# Altium footprint library Regular_Components.PcbLib: 42 footprints (part 3 of 3)
Each footprint in its own frame and in the unit in brackets; x right, y up, seen from the top. Pads: shape width x height; smd on the part's side, far side on the other; paste and mask are expansions set on the pad; w line width, h text height; cw(c..) or ccw(c..) is an arc to the next point about the centre after c.
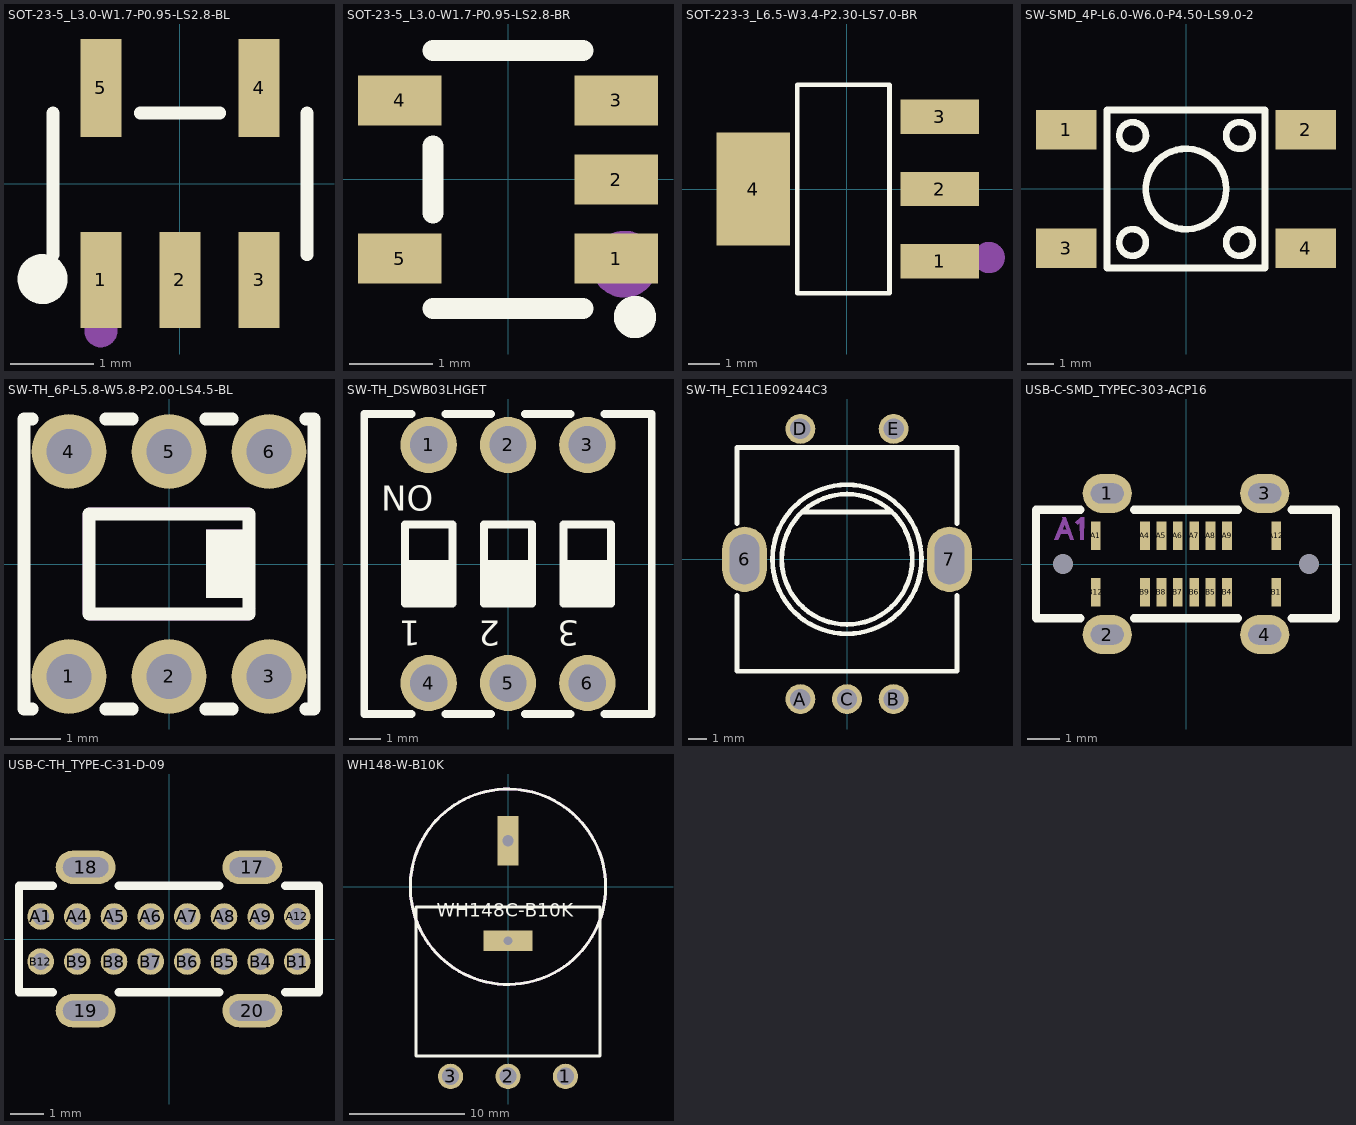
[diagram p2: the footprints below, top view; thin cyan lines are the x and y axes]

## SOT-23-5_L3.0-W1.7-P0.95-LS2.8-BL [mm]
pads (5):
  rect 0.49x1.157 smd: 1(-0.95,-1.154) 2(0,-1.154) 3(0.95,-1.154)
  rect 0.49x1.175 smd: 4(0.95,1.154) 5(-0.95,1.154)
Top Overlay:
  circle w0.3: c-1.651,-1.143 r0.15
  lines w0.152: -1.526,-0.851 -1.526,0.851 ; -0.476,0.851 0.476,0.851 ; 1.526,-0.851 1.526,0.851
Mechanical 15:
  circle w0.2: c-0.95,-1.763 r0.1
3D body "SOT-23-5_L3.0-W1.7-P0.95-LS2.8-BR.STEP": height 1.2, standoff 0, extent -1.37,-1.425 1.414,1.468

## SOT-23-5_L3.0-W1.7-P0.95-LS2.8-BR [mm]
pads (5):
  rect 1x0.6 smd: 1(1.3,-0.95) 2(1.3,0) 3(1.3,0.95) 4(-1.3,0.95) 5(-1.3,-0.95)
Top Overlay:
  circle w0.254: c1.524,-1.651 r0.127
  lines w0.254: -0.9,-1.55 0.9,-1.55 ; -0.9,-0.4 -0.9,0.4 ; -0.9,1.55 0.9,1.55
Mechanical 15:
  circle w0.4: c1.397,-1.016 r0.2
3D body "SOT-23-5_L3.0-W1.7-P0.95-LS2.8-BR.STEP": height 1.2, standoff 0, extent -1.468,-1.37 1.425,1.414

## SOT-223-3_L6.5-W3.4-P2.30-LS7.0-BR [mm]
pads (4):
  rect 2.5x1.1 smd: 1(2.97,-2.3) 2(2.97,0) 3(2.97,2.3)
  rect 2.34x3.6 smd: 4(-2.97,0)
Top Overlay:
  lines w0.152: -1.571,-3.326 -1.571,3.326 1.371,3.326 1.371,-3.326 -1.571,-3.326
Mechanical 15:
  circle w0.5: c4.552,-2.188 r0.25
3D body "SOT-223-3_L6.5-W3.4-P2.30-LS7.0-BR.STEP": height 1.75, standoff 0, extent -3.655,-3.25 3.455,3.25

## SW-SMD_4P-L6.0-W6.0-P4.50-LS9.0-2 [mm]
pads (4):
  rect 2.3x1.5 smd: 1(-4.55,2.25) 2(4.55,2.25) 3(-4.55,-2.25) 4(4.55,-2.25)
Top Overlay:
  circle w0.254: c0,0 r1.529
  circle w0.254: c2.032,-2.032 r0.508
  circle w0.254: c-2.032,-2.032 r0.508
  circle w0.254: c2.032,2.032 r0.508
  circle w0.254: c-2.03,2.03 r0.508
  lines w0.254: -3,-3 3,-3 3,3 -3,3 -3,-3
3D body "SW-SMD_4P-L6.0-W6.0-P4.50-LS9.0-2.STEP": height 3.4, standoff 0, extent -4.2,-3.2 4.2,3.2

## SW-TH_6P-L5.8-W5.8-P2.00-LS4.5-BL [mm]
pads (6):
  round 1.5 hole 0.9: 1(-2,-2.25) 2(0,-2.25) 3(2,-2.25) 4(-2,2.25) 5(0,2.25) 6(2,2.25)
Top Overlay:
  region: 0.74,0.68 0.74,-0.66 0.74,-0.67 1.48,-0.67 1.48,0.68
  lines w0.254: -2.734,-2.9 -2.9,-2.9 -2.9,-1.749 -2.9,1.749 -2.9,2.9 -2.734,2.9 ; -1.266,-2.9 -0.734,-2.9 ; -1.266,2.9 -0.734,2.9 ; 0.734,-2.9 1.266,-2.9 ; 0.734,2.9 1.266,2.9 ; 2.734,-2.9 2.9,-2.9 2.9,-1.749 2.9,1.749 2.9,2.9 2.734,2.9 ; -1.6,-1 -1.6,1 1.6,1 1.6,-1 -1.6,-1
Mechanical 15:
  region: 0.74,0.68 0.74,-0.66 0.74,-0.67 1.48,-0.67 1.48,0.68
  region: 1.6,-0.88 1.72,-0.88 1.6,-1.12 -1.59,-1.12 -1.72,-0.99 -1.72,1.01 -1.61,1.12 1.6,1.12 1.71,1.05 1.71,-0.87 1.48,-0.87 1.48,0.88 -1.48,0.88 -1.48,-0.88
3D body "SW-TH_6P-L5.8-W5.8-P2.00-LS4.5-BL.STEP": height 8, standoff -3.5, extent -2.9,-2.9 2.9,2.901

## SW-TH_DSWB03LHGET [mm]
pads (6):
  round 1.8 hole 1.2: 1(-2.54,3.81) 2(0,3.81) 3(2.54,3.81) 4(-2.54,-3.81) 5(0,-3.81) 6(2.54,-3.81)
Top Overlay:
  lines w0.254: -3.302,-1.016 -1.778,-1.016 ; -3.302,-0.762 -1.778,-0.762 ; -3.302,-0.508 -1.778,-0.508 ; -3.302,-0.254 -1.778,-0.254 ; -3.302,0 -1.778,0 ; -3.084,-4.8 -4.6,-4.8 -4.6,4.8 -3.084,4.8 ; -1.996,-4.8 -0.544,-4.8 ; -1.996,4.8 -0.544,4.8 ; -0.762,-1.016 0.762,-1.016 ; -0.762,-0.762 0.762,-0.762 ; -0.762,-0.508 0.762,-0.508 ; -0.762,-0.254 0.762,-0.254 ; -0.762,0 0.762,0 ; 0.544,-4.8 1.996,-4.8 ; 0.544,4.8 1.996,4.8 ; 1.778,-1.016 3.302,-1.016 ; 1.778,-0.762 3.302,-0.762 ; 1.778,-0.508 3.302,-0.508 ; 1.778,-0.254 3.302,-0.254 ; 1.778,0 3.302,0 ; 3.084,-4.8 4.6,-4.8 4.6,4.8 3.084,4.8 ; -3.302,-1.27 -1.778,-1.27 -1.778,1.27 -3.302,1.27 -3.302,-1.27 ; -0.762,-1.27 0.762,-1.27 0.762,1.27 -0.762,1.27 -0.762,-1.27 ; 1.778,-1.27 3.302,-1.27 3.302,1.27 1.778,1.27 1.778,-1.27
  text "NO" at -4.064,1.703 h0.8
  text "1" at -2.794,-1.815 h0.8
  text "2" at -0.254,-1.815 h0.8
  text "3" at 2.286,-1.815 h0.8
3D body "SW-TH_DSWB03LHGET.STEP": height 6.6, standoff -3.2, extent -4.59,-4.951 4.59,4.95

## SW-TH_EC11E09244C3 [mm]
pads (7):
  oval 2.4x3.5 hole 1.6 slot 2.7 at 90 deg: 6(-5.5,-0.004) 7(5.5,-0.004)
  round 1.6 hole 1.1: A(-2.5,-7.504) B(2.5,-7.504) C(0,-7.504) D(-2.5,6.996) E(2.5,6.996)
Top Overlay:
  circle w0.254: c0,0 r4
  circle w0.254: c0,0 r3.5
  lines w0.254: -5.9,-6.004 5.9,-6.004 5.9,-1.928 ; -5.9,-5.934 -5.9,-1.928 ; -5.9,1.92 -5.9,5.996 5.9,5.996 5.9,1.92 ; -2.41,2.536 2.32,2.536
3D body "SW-TH_EC11E09244C3.STEP": height 19.49, standoff -3.51, extent -6.423,-7.45 6.42,7.45

## USB-C-SMD_TYPEC-303-ACP16 [mm]
pads (22):
  oval 1.5x1.2 hole 0.61 slot 1 at 0 deg: 1(-2.4,2.15) 2(-2.4,-2.15) 3(2.4,2.15) 4(2.4,-2.15)
  rect 0.3x0.87 smd: A1(-2.75,0.865) A4(-1.25,0.865) A5(-0.75,0.865) A6(-0.25,0.865) A7(0.25,0.865) A8(0.75,0.865) A9(1.25,0.865) A12(2.75,0.865) B1(2.75,-0.865) B4(1.25,-0.865) B5(0.75,-0.865) B6(0.25,-0.865) B7(-0.25,-0.865) B8(-0.75,-0.865) B9(-1.25,-0.865) B12(-2.75,-0.865)
  round 0.6 hole 0.6 unplated: ""(-3.75,0) ""(3.75,0)
Top Overlay:
  lines w0.254: -4.572,1.397 -4.572,1.651 -3.214,1.651 ; -4.572,1.524 -4.572,-1.651 -3.214,-1.651 ; -1.586,-1.651 1.586,-1.651 ; -1.586,1.651 1.586,1.651 ; 3.214,-1.651 4.572,-1.651 4.572,1.524 4.572,1.651 3.214,1.651
Top Paste:
  drawing of 20 lines, arcs and shapes, not listed
Mechanical 15:
  circle w0.2: c3.75,0 r0.1
  circle w0.2: c-3.75,0 r0.1
  region: -3.759,1.05 -3.646,1.049 -3.599,0.917 -3.811,0.921
  region: -3.702,1.205 -3.889,0.735 -4.013,0.737 -3.763,1.382
  region: -3.532,0.733 -3.419,0.734 -3.669,1.42 -3.777,1.419 -3.775,1.419
  region: -3.304,1.196 -3.365,1.257 -3.366,1.258 -3.368,1.261 -3.369,1.264 -3.37,1.267 -3.37,1.269 -3.201,1.423 -3.108,1.421 -3.119,0.743 -3.23,0.741 -3.234,1.26

## USB-C-TH_TYPE-C-31-D-09 [mm]
pads (20):
  oval 1.8x1 hole 0.6 slot 1.365 at 0 deg: 17(2.5,2.15) 18(-2.5,2.15) 19(-2.5,-2.15) 20(2.5,-2.15)
  round 0.8 hole 0.5: A1(-3.85,0.675) A4(-2.75,0.675) A5(-1.65,0.675) A6(-0.55,0.675) A7(0.55,0.675) A8(1.65,0.675) A9(2.75,0.675) A12(3.85,0.675) B1(3.85,-0.675) B4(2.75,-0.675) B5(1.65,-0.675) B6(0.55,-0.675) B7(-0.55,-0.675) B8(-1.65,-0.675) B9(-2.75,-0.675) B12(-3.85,-0.675)
Top Overlay:
  lines w0.254: -3.488,-1.6 -4.5,-1.6 -4.5,1.6 -3.488,1.6 ; -1.512,-1.6 1.512,-1.6 ; -1.512,1.6 1.512,1.6 ; 3.488,-1.6 4.5,-1.6 4.5,1.6 3.488,1.6
3D body "USB-C-TH_TYPE-C-31-D-09.STEP": height 6.5, standoff -1.9, extent -4.47,-2.3 4.47,2.3

## WH148-W-B10K [mm]
pads (5):
  round 2.2 hole 1.5: 1(5,-16.5) 2(0,-16.5) 3(-5,-16.5)
  rect 4.3x1.8 hole 0.762 square: ""(0,-4.7)
  rect 1.8x4.3 hole 1 square: ""(0,4)
Top Overlay:
  circle w0.254: c0,0 r8.5
  lines w0.254: -8.013,-14.746 8,-14.746 8,-1.767 -8.013,-1.767 -8.013,-14.746
  text "WH148C-B10K" at -6.214,-3.024 h2
Mechanical 5:
  circle w0.254: c0,0 r8.5
3D body "WH148-W-B10K.STEP": height 26.5, standoff -3.8, extent -8.475,-16.649 8.425,8.502